# Altium footprint library Connector.PcbLib: 230 footprints (part 3 of 15)
Each footprint in its own frame and in the unit in brackets; x right, y up, seen from the top. Pads: shape width x height; smd on the part's side, far side on the other; paste and mask are expansions set on the pad; w line width, h text height; cw(c..) or ccw(c..) is an arc to the next point about the centre after c.
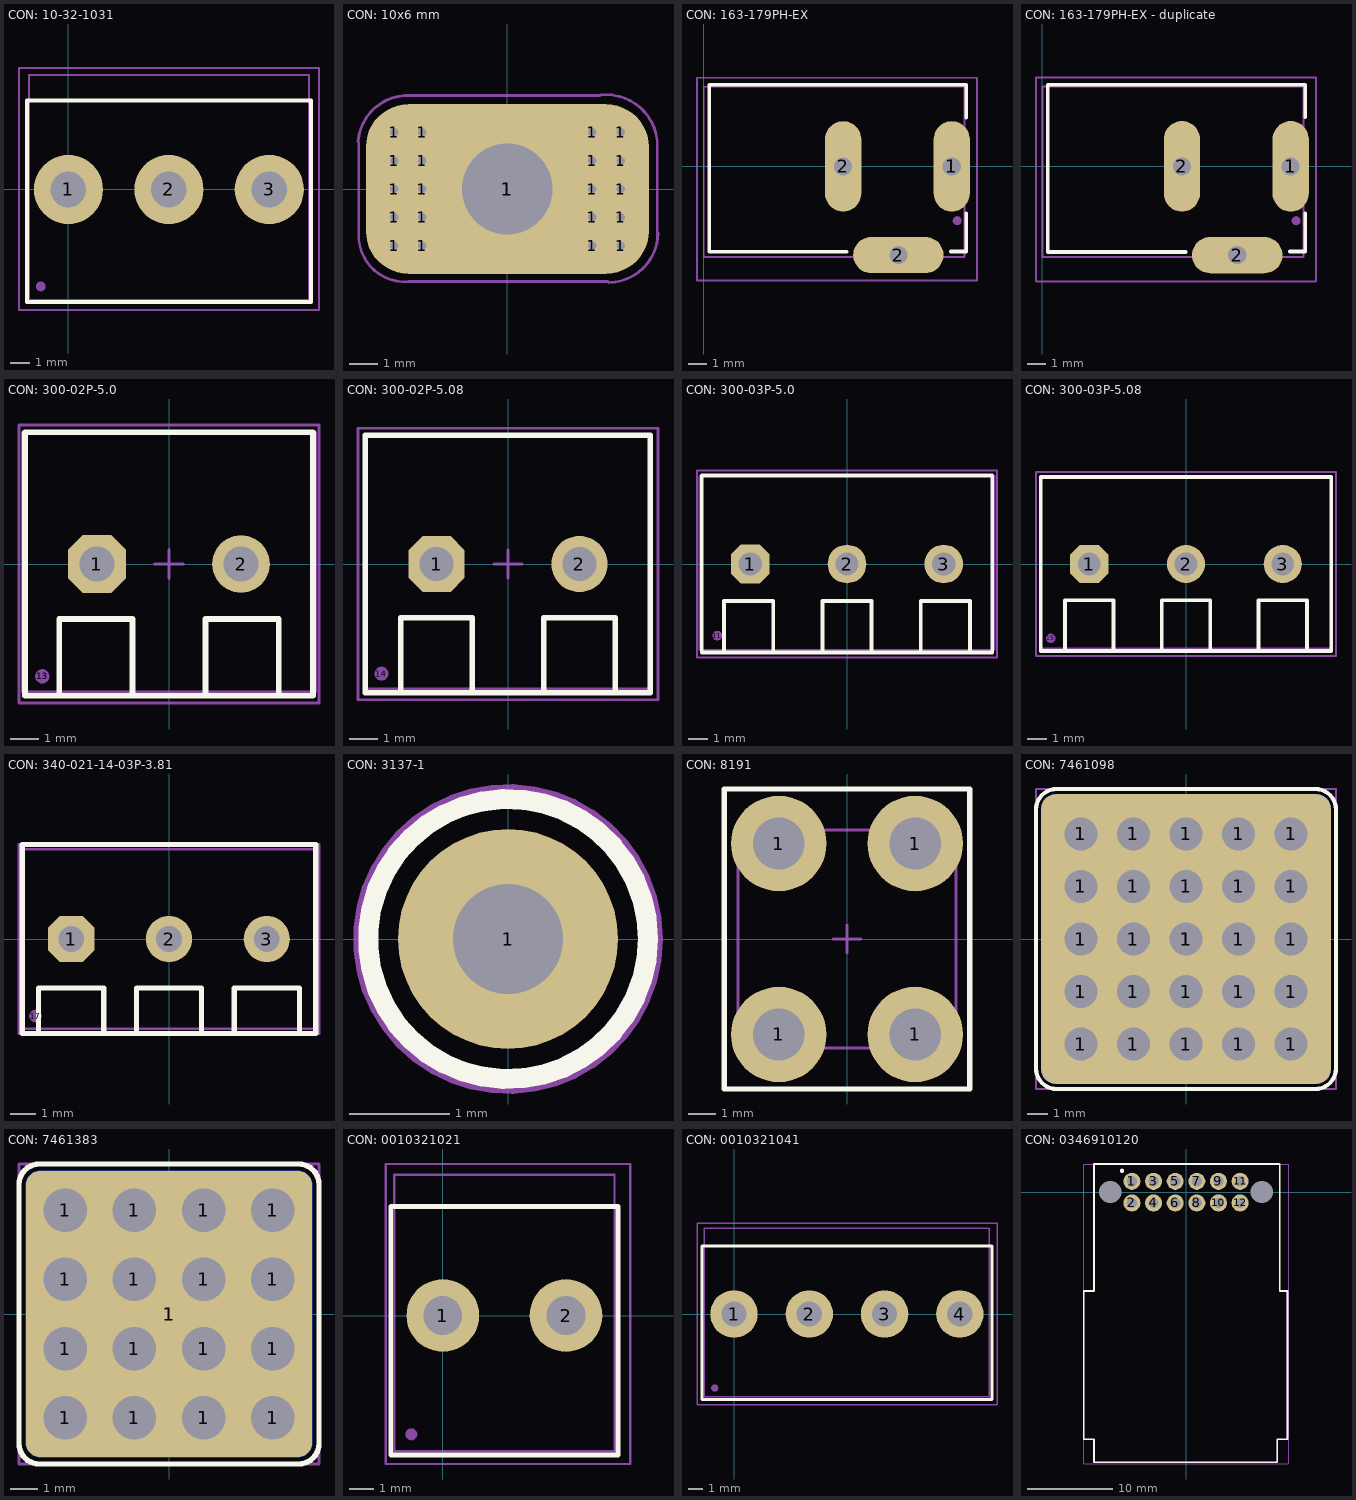
[diagram p2: the footprints below, top view; thin cyan lines are the x and y axes]

## CON: 10-32-1031 [mm]
pads (4):
  round 3.5 hole 1.8: 1(0,0) 2(5.08,0) 3(10.16,0)
  round 0.5 on Mech1: ""(-1.4,-4.9)
Top Overlay:
  lines w0.2: -2.1,-5.7 -2.1,4.5 12.275,4.5 12.275,-5.7 11.8,-5.7 -2.1,-5.7
TopAssy:
  lines w0.1: -2,-5.6 12.16,-5.6 12.16,5.8 -2,5.8 -2,-5.6
Border:
  lines w0.1: -2.5,-6.1 -2.5,6.15 12.675,6.15 12.675,-6.1 -2.5,-6.1
3D body "010321031.stp": height 13.85, standoff -3.6, extent -2,-5.6 12.16,5.8

## CON: 10x6 mm [mm]
pads (22):
  round 0.7 hole 0.3: 1(-4,-2) 1(-4,-1) 1(-4,0) 1(-4,1) 1(-4,2) 1(-3,-2) 1(-3,-1) 1(-3,0) 1(-3,1) 1(-3,2) 1(3,-2) 1(3,-1) 1(3,0) 1(3,1) 1(3,2) 1(4,-2) 1(4,-1) 1(4,0) 1(4,1) 1(4,2)
  round 5 hole 3.2: 1(0,0)
  rrect50% 10x6 smd: 1(0,0)
Border:
  lines w0.1: -5.275,1.675 cw(c-3.525,1.55) -3.4,3.3 3.275,3.3 ; -5.25,1.65 -5.25,-1.775 ccw(c-3.625,-1.65) -3.5,-3.275 3.55,-3.275 ; 3.3,3.325 cw(c3.487,1.512) 5.3,1.7 5.3,-1.925 ; 3.575,-3.3 ccw(c3.575,-1.55) 5.325,-1.55
Multi-Layer:
  region: 2,4
  region: -5,4

## CON: 163-179PH-EX [mm]
pads (4):
  oval 2x5 hole 1 square: 1(13.7,0) 2(7.7,0)
  oval 5x2 hole 1 square: 2(10.75,-4.9)
  round 0.5 on Mech1: ""(14,-3)
Top Overlay:
  lines w0.2: 7.9,-4.725 0.3,-4.725 0.3,4.5 14.5,4.5 14.5,2.7 ; 13.65,-4.7 14.5,-4.7 14.5,-2.6
TopAssy:
  lines w0.1: 0,-5 14.4,-5 14.4,4.4 0,4.4 0,-5
Border:
  lines w0.1: -0.375,-6.3 -0.375,-5.35 -0.375,4.9 15.1,4.9 15.1,-6.3 -0.375,-6.3
3D body "User Library-PJ-002AH.STEP": height 11.05, standoff -3.45, extent 0,-5 14.4,4.4

## CON: 163-179PH-EX - duplicate [mm]
pads (4):
  oval 2x5 hole 1 square: 1(13.7,0) 2(7.7,0)
  oval 5x2 hole 1 square: 2(10.75,-4.9)
  round 0.5 on Mech1: ""(14,-3)
Top Overlay:
  lines w0.2: 7.9,-4.725 0.3,-4.725 0.3,4.5 14.5,4.5 14.5,2.7 ; 13.65,-4.7 14.5,-4.7 14.5,-2.6
TopAssy:
  lines w0.1: 0,-5 14.4,-5 14.4,4.4 0,4.4 0,-5
Border:
  lines w0.1: -0.35,-6.35 15.1,-6.35 15.1,4.9 -0.35,4.9 -0.35,-6.35
3D body "User Library-PJ-002AH.STEP": height 11.05, standoff -3.45, extent 0,-5 14.4,4.4

## CON: 300-02P-5.0 [mm] "2 pin 5.08mm screw connector"
height 12.5
pads (3):
  oct 2x2 hole 1.2: 1(-2.5,0)
  round 2 hole 1.2: 2(2.5,0)
  round 0.5 on Mech1: 13(-4.4,-3.9)
Top Overlay:
  lines w0.2: -3.81,-4.572 -3.81,-1.905 -1.27,-1.905 -1.27,-4.445 ; 1.27,-4.572 1.27,-1.905 3.81,-1.905 3.81,-4.445 ; -5,-4.572 -5,4.572 5,4.572 5,-4.572 -5,-4.572
TopAssy:
  lines w0.1: -5.08,-4.445 5.08,-4.445 5.08,4.555 -5.08,4.555 -5.08,-4.445
Border:
  lines w0.1: -0.5,0 0.5,0 ; 0,-0.5 0,0.5 ; -5.207,-4.826 5.207,-4.826 5.207,4.826 -5.207,4.826 -5.207,-4.826
3D body "300-02.STEP": height 12.5, standoff -4, extent -5.08,-4.445 5.08,4.555

## CON: 300-02P-5.08 [mm] "2 pin 5.08mm screw connector"
height 12.5
pads (3):
  oct 2x2 hole 1.2: 1(-2.54,0)
  round 2 hole 1.2: 2(2.54,0)
  round 0.5 on Mech1: 14(-4.5,-3.9)
Top Overlay:
  lines w0.2: -3.81,-4.572 -3.81,-1.905 -1.27,-1.905 -1.27,-4.445 ; 1.27,-4.572 1.27,-1.905 3.81,-1.905 3.81,-4.445 ; -5.08,-4.572 -5.08,4.572 5.063,4.572 5.063,-4.572 -5.08,-4.572
TopAssy:
  lines w0.1: -5.08,-4.445 5.08,-4.445 5.08,4.555 -5.08,4.555 -5.08,-4.445
Border:
  lines w0.1: -0.5,0 0.5,0 ; 0,-0.5 0,0.5 ; -5.334,-4.826 5.334,-4.826 5.334,4.826 -5.334,4.826 -5.334,-4.826
3D body "300-02.STEP": height 12.5, standoff -4, extent -5.08,-4.445 5.08,4.555

## CON: 300-03P-5.0 [mm] "3 pin 5.08mm screw connector"
height 12.5
pads (4):
  oct 2x2 hole 1.2: 1(-5,0)
  round 2 hole 1.2: 2(0,0) 3(5,0)
  round 0.5 on Mech1: 11(-6.7,-3.7)
Top Overlay:
  lines w0.2: -6.35,-4.572 -6.35,-1.905 -3.81,-1.905 -3.81,-4.445 ; -1.27,-4.572 -1.27,-1.905 1.27,-1.905 1.27,-4.445 ; 3.81,-4.572 3.81,-1.905 6.35,-1.905 6.35,-4.445 ; -7.5,-4.572 7.5,-4.572 7.5,4.572 -7.5,4.572 -7.5,-4.572
TopAssy:
  lines w0.1: -7.62,-4.445 -7.62,4.555 7.62,4.555 7.62,-4.445 -7.62,-4.445
Border:
  lines w0.1: -0.5,0 0.5,0 ; 0,-0.5 0,0.5 ; -7.747,-4.826 -7.747,4.826 7.747,4.826 7.747,-4.826 -7.747,-4.826
3D body "300-03.STEP": height 12.5, standoff -4, extent -7.75,-4.475 7.49,4.525

## CON: 300-03P-5.08 [mm] "3 pin 5.08mm screw connector"
height 12.5
pads (4):
  oct 2x2 hole 1.2: 1(-5.08,0)
  round 2 hole 1.2: 2(0,0) 3(5.08,0)
  round 0.5 on Mech1: 15(-7.1,-3.9)
Top Overlay:
  lines w0.2: -6.35,-4.572 -6.35,-1.905 -3.81,-1.905 -3.81,-4.445 ; -1.27,-4.572 -1.27,-1.905 1.27,-1.905 1.27,-4.445 ; 3.81,-4.572 3.81,-1.905 6.35,-1.905 6.35,-4.445 ; -7.62,-4.572 7.62,-4.572 7.62,4.572 -7.62,4.572 -7.62,-4.572
TopAssy:
  lines w0.1: -7.62,-4.445 -7.62,4.555 7.62,4.555 7.62,-4.445 -7.62,-4.445
Border:
  lines w0.1: -0.5,0 0.5,0 ; 0,-0.5 0,0.5 ; -7.874,-4.826 -7.874,4.826 7.874,4.826 7.874,-4.826 -7.874,-4.826
3D body "300-03.STEP": height 12.5, standoff -4, extent -7.62,-4.445 7.62,4.555

## CON: 340-021-14-03P-3.81 [mm] "3.81 3pin screw connector"
height 9
pads (4):
  oct 1.8x1.8 hole 1: 1(-3.81,0)
  round 1.8 hole 1: 2(0,0) 3(3.81,0)
  round 0.5 on Mech1: 17(-5.2,-3)
Top Overlay:
  lines w0.2: -5.08,-3.683 -5.08,-1.905 -2.54,-1.905 -2.54,-3.683 ; -1.27,-3.683 -1.27,-1.905 1.27,-1.905 1.27,-3.683 ; 2.54,-3.683 2.54,-1.905 5.08,-1.905 5.08,-3.683 ; -5.715,-3.683 5.715,-3.683 5.715,3.683 -5.715,3.683 -5.715,-3.683
TopAssy:
  lines w0.1: -5.715,-3.5 -5.715,3.5 5.715,3.5 5.715,-3.5 -5.715,-3.5
Border:
  lines w0.1: -0.5,0 0.5,0 ; 0,-0.5 0,0.5 ; -5.842,-3.683 -5.842,3.683 5.842,3.683 5.842,-3.683 -5.842,-3.683
3D body "340-021-14-3pin.STEP": height 8.5, standoff -4, extent -5.715,-3.5 5.715,3.5

## CON: 3137-1 [mm]
pads (1):
  round 2.2 hole 1.1: 1(0,0)
Top Overlay:
  circle w0.2: c0,0 r1.4
TopAssy:
  circle w0.1: c0,0 r1.4
Border:
  circle w0.1: c0,0 r1.5
3D body "mill-max-3137-1-00-15-00-00-08-0.STEP": height 1.1, standoff -6.57, extent -0.775,-0.775 0.8,0.8

## CON: 8191 [mm]
pads (4):
  round 3.5 hole 1.9: 1(-2.5,-3.5) 1(-2.5,3.5) 1(2.5,-3.5) 1(2.5,3.5)
Top Overlay:
  lines w0.2: -4.5,-5.5 -4.5,-2.5 -4.5,5.5 4.5,5.5 4.5,-5.5 -4.5,-5.5
TopAssy:
  lines w0.1: -4,-4 -4,4 4,4 4,-4 -4,-4
Border:
  lines w0.1: -0.5,0 0.5,0 ; 0,-0.5 0,0.5 ; -4.5,-5.5 4.5,-5.5 4.5,5.5 -4.5,5.5 -4.5,-5.5
3D body "User Library-Terminal 10A Keystone 8191.STEP": height 7.05, standoff -4.45, extent -4,-4 4,4

## CON: 7461098 [mm]
pads (27):
  round 2.5 hole 1.6: 1(-5.08,-5.08) 1(-5.08,-2.54) 1(-5.08,0) 1(-5.08,2.54) 1(-5.08,5.08) 1(-2.54,-5.08) 1(-2.54,-2.54) 1(-2.54,0) 1(-2.54,2.54) 1(-2.54,5.08) 1(0,-5.08) 1(0,-2.54) 1(0,0) 1(0,2.54) 1(0,5.08) 1(2.54,-5.08) 1(2.54,-2.54) 1(2.54,0) 1(2.54,2.54) 1(2.54,5.08) 1(5.08,-5.08) 1(5.08,-2.54) 1(5.08,0) 1(5.08,2.54) 1(5.08,5.08)
  rrect10% 14x14 smd: 1(0,0)
  rrect10% 14x14 smd far side: 1(0,0)
Top Overlay:
  lines w0.2: -7.25,-6.25 ccw(c-6.25,-6.25) -6.25,-7.25 6.25,-7.25 ccw(c6.25,-6.25) 7.25,-6.25 7.25,6.25 ccw(c6.25,6.25) 6.25,7.25 -6.25,7.25 ccw(c-6.25,6.25) -7.25,6.25 -7.25,-6.25
TopAssy:
  lines w0.1: -6.5,6.5 6.5,6.5 6.5,-6.5 ; -6.5,6.5 -6.5,-6.5 6.5,-6.5 ; -6.5,6.5 -6.5,6.5 ; 6.5,-6.5 6.5,-6.5
Border:
  lines w0.1: -0.5,0 0.5,0 ; 0,-0.5 0,0.5 ; -7.25,-7.25 -7.25,7.25 7.25,7.25 7.25,-7.25 -7.25,-7.25
3D body "74610981.STEP": height 15.5, standoff -3.5, extent -6.5,-6.5 6.5,6.5

## CON: 7461383 [mm]
pads (18):
  round 2.5 hole 1.6: 1(-3.81,-3.81) 1(-3.81,-1.27) 1(-3.81,1.27) 1(-3.81,3.81) 1(-1.27,-3.81) 1(-1.27,-1.27) 1(-1.27,1.27) 1(-1.27,3.81) 1(1.27,-3.81) 1(1.27,-1.27) 1(1.27,1.27) 1(1.27,3.81) 1(3.81,-3.81) 1(3.81,-1.27) 1(3.81,1.27) 1(3.81,3.81)
  rrect10% 10.5x10.5 smd: 1(0,0)
  rrect10% 10.5x10.5 smd far side: 1(0,0)
Top Overlay:
  lines w0.2: -5.5,-4.75 ccw(c-4.75,-4.75) -4.75,-5.5 4.75,-5.5 ccw(c4.75,-4.75) 5.5,-4.75 5.5,4.75 ccw(c4.75,4.75) 4.75,5.5 -4.75,5.5 ccw(c-4.75,4.75) -5.5,4.75 -5.5,-4.75
TopAssy:
  lines w0.1: -4.5,-4.5 4.5,-4.5 4.5,4.5 -4.5,4.5 ; -4.5,-4.5 -4.5,-4.5 ; -4.5,-4.5 -4.5,4.5 ; -4.5,4.5 -4.5,4.5
Border:
  lines w0.1: -0.5,0 0.5,0 ; 0,-0.5 0,0.5 ; -5.5,-5.5 5.5,-5.5 5.5,5.5 -5.5,5.5 -5.5,-5.5
3D body "7461383.STEP": height 12.5, standoff -3.5, extent -4.5,-4.5 4.5,4.5

## CON: 0010321021 [mm]
pads (3):
  round 3 hole 1.6: 1(0,0) 2(5.08,0)
  round 0.5 on Mech1: ""(-1.3,-4.9)
Top Overlay:
  lines w0.2: -2.15,-5.75 7.225,-5.75 7.225,4.5 -2.15,4.5 -2.15,-5.75
TopAssy:
  lines w0.1: -2,-5.6 7.08,-5.6 7.08,5.8 -2,5.8 -2,-5.6
Border:
  lines w0.1: -2.35,-6.125 -2.35,6.25 7.725,6.25 7.725,-6.125 -2.35,-6.125
3D body "010321021.stp": height 13.85, standoff -3.6, extent -2,-5.6 7.08,5.8

## CON: 0010321041 [mm]
pads (5):
  round 3.2 hole 1.7: 1(0,0) 2(5.08,0) 3(10.16,0) 4(15.24,0)
  round 0.5 on Mech1: ""(-1.3,-5)
Top Overlay:
  lines w0.2: -2.175,-5.775 -2.175,4.6 17.4,4.6 17.4,-5.775 -2.175,-5.775
TopAssy:
  lines w0.1: -2,-5.6 -2,5.8 17.24,5.8 17.24,-5.6 -2,-5.6
Border:
  lines w0.1: -2.5,-6.125 -2.5,6.125 17.75,6.125 17.75,-6.125 -2.5,-6.125
3D body "010321041.stp": height 13.85, standoff -3.6, extent -2,-5.6 17.24,5.8

## CON: 0346910120 [mm]
pads (16):
  round 2 hole 1.2: 1(-6.35,1.27) 2(-6.35,-1.27) 3(-3.81,1.27) 4(-3.81,-1.27) 5(-1.27,1.27) 6(-1.27,-1.27) 7(1.27,1.27) 8(1.27,-1.27) 9(3.81,1.27) 10(3.81,-1.27) 11(6.35,1.27) 12(6.35,-1.27)
  round 0 hole 2.6: ""(-8.89,0) ""(8.89,0)
  round 0.5 on Top Overlay: ""(-7.5,2.5)
  round 0.5 on Mech1: ""(-7.5,2.5)
Top Overlay:
  lines w0.2: -12,-29 -10.8,-29 -10.8,-31.7 10.7,-31.7 10.7,-29 11.9,-29 11.9,-11.6 11,-11.6 11,3.3 -10.8,3.3 -10.8,-11.6 -12,-11.6 -12,-29
TopAssy:
  lines w0.1: -12,-29 -12,-11.6 -10.8,-11.6 -10.8,3.3 11,3.3 11,-11.6 11.9,-11.6 11.9,-29 10.7,-29 10.7,-31.7 -10.8,-31.7 -10.8,-29 -12,-29
Border:
  lines w0.1: -12,-31.9 12,-31.9 12,3.3 -12,3.3 -12,-31.9
3D body "2.STEP": height 22.06, standoff -3.4, extent -12,-31.882 11.94,3.282